# Altium footprint library JL_PCB.PCBLIB: 1129 footprints (part 12 of 72)
Each footprint in its own frame and in the unit in brackets; x right, y up, seen from the top. Pads: shape width x height; smd on the part's side, far side on the other; paste and mask are expansions set on the pad; w line width, h text height; cw(c..) or ccw(c..) is an arc to the next point about the centre after c.
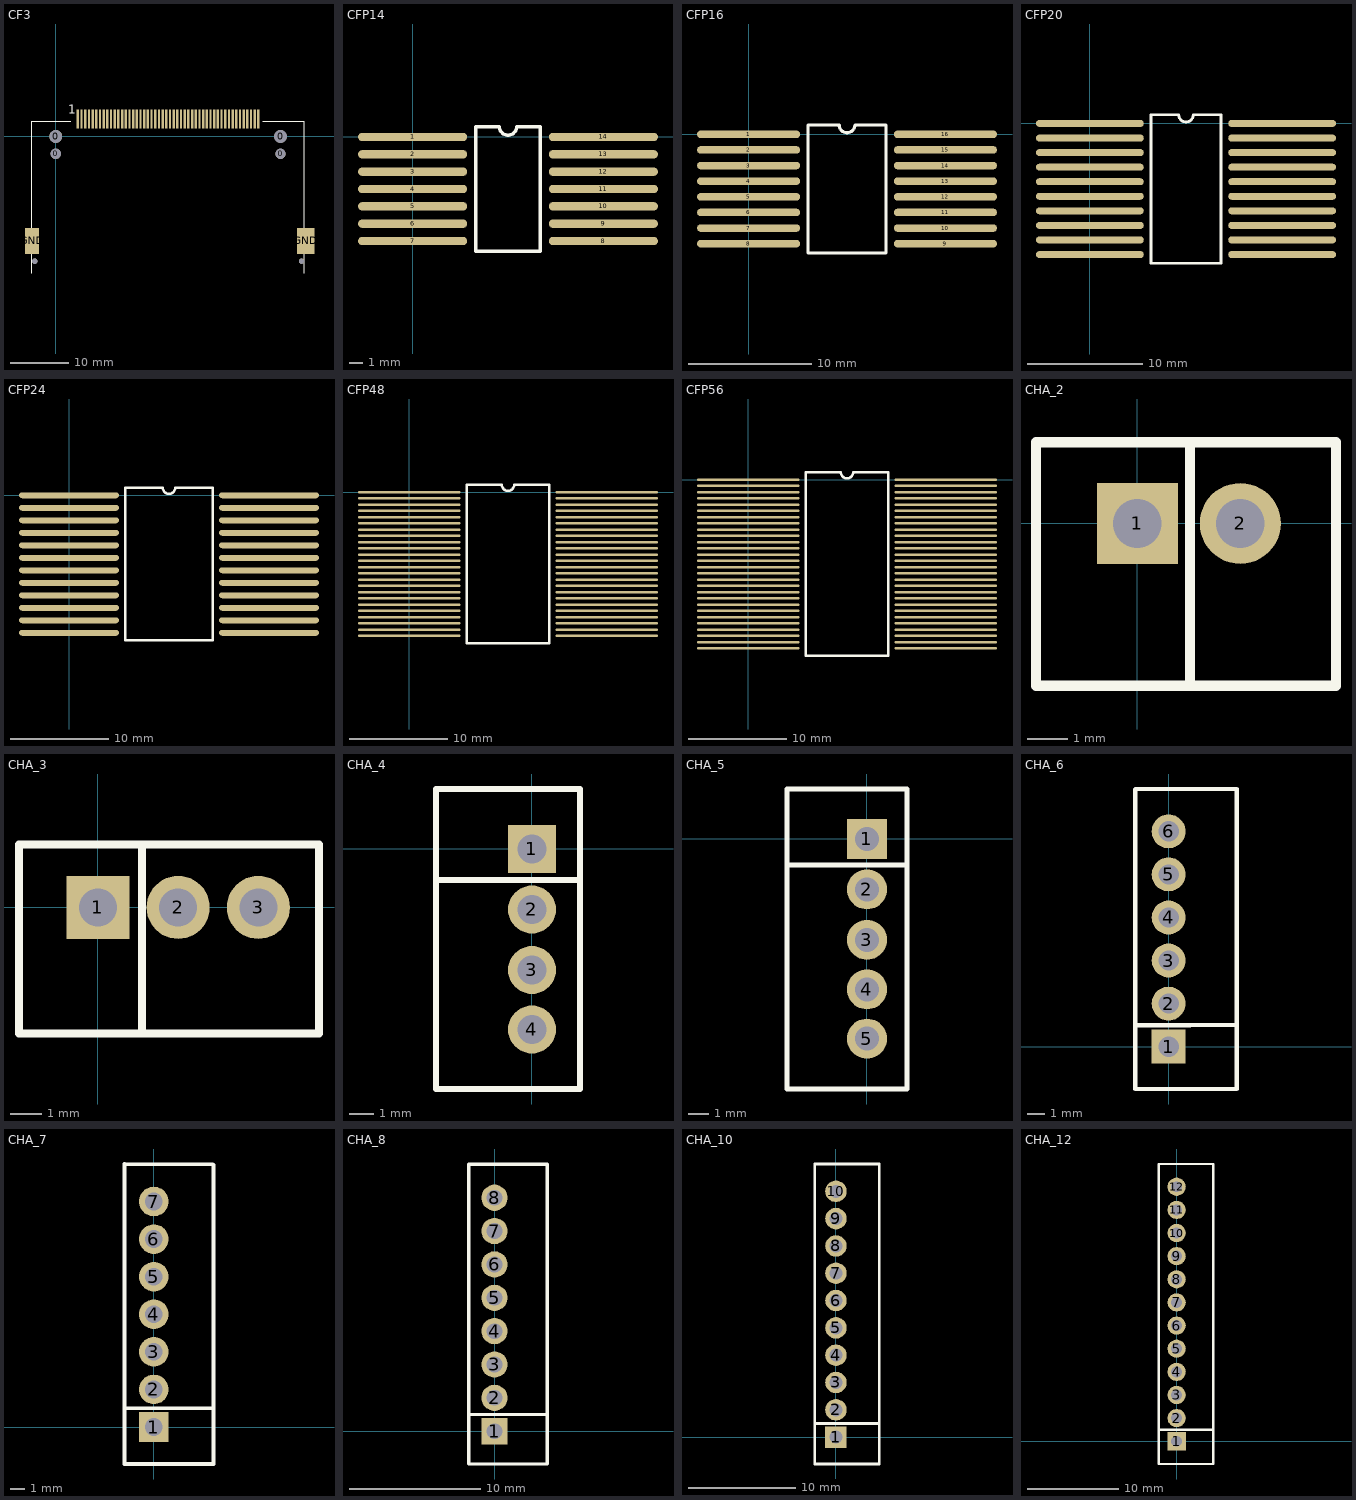
[diagram p11: the footprints below, top view; thin cyan lines are the x and y axes]

## CF3 [mm]
pads (58):
  round 0.9 hole 0.9 unplated: 0(-3.63,-21.5) 0(42.37,-21.5)
  round 1.75 hole 1.75 unplated: 0(0,-3) 0(38.735,-3)
  round 2.2 hole 2.2 unplated: 0(0,0) 0(38.735,0)
  rect 0.4x3.302 smd: 1(3.81,3.004) 2(5.08,3.004) 3(6.35,3.004) 4(7.62,3.004) 5(8.89,3.004) 6(10.16,3.004) 7(11.43,3.004) 8(12.7,3.004) 9(13.97,3.004) 10(15.24,3.004) 11(16.51,3.004) 12(17.78,3.004) 13(19.05,3.004) 14(20.32,3.004) 15(21.59,3.004) 16(22.86,3.004) 17(24.13,3.004) 18(25.4,3.004) 19(26.67,3.004) 20(27.94,3.004) 21(29.21,3.004) 22(30.48,3.004) 23(31.75,3.004) 24(33.02,3.004) 25(34.29,3.004) 26(4.445,3.004) 27(5.715,3.004) 28(6.985,3.004) 29(8.255,3.004) 30(9.525,3.004) 31(10.795,3.004) 32(12.065,3.004) 33(13.335,3.004) 34(14.605,3.004) 35(15.875,3.004) 36(17.145,3.004) 37(18.415,3.004) 38(19.685,3.004) 39(20.955,3.004) 40(22.225,3.004) 41(23.495,3.004) 42(24.765,3.004) 43(26.035,3.004) 44(27.305,3.004) 45(28.575,3.004) 46(29.845,3.004) 47(31.115,3.004) 48(32.385,3.004) 49(33.655,3.004) 50(34.925,3.004)
  rect 2.4x4.5 smd: GND(-4.09,-18)
  rect 3x4.5 smd: GND(43.12,-18)
TopOverlay:
  lines w0.152: -4.13,2.6 2.585,2.6 ; 35.66,2.6 42.87,2.6
  lines w0.2: -4.13,-23.6 -4.13,2.6 ; 42.87,-23.6 42.87,2.6
  text "1" at 2.11,3.95 h1.52

## CFP14 [mil]
pads (14):
  oval 315x24 smd: 1(0,0) 2(0,-50) 3(0,-100) 4(0,-150) 5(0,-200) 6(0,-250) 7(0,-300) 8(550,-300) 9(550,-250) 10(550,-200) 11(550,-150) 12(550,-100) 13(550,-50) 14(550,0)
TopOverlay:
  lines w10: 182,-330 182,30 250,30 ccw(c275,30) 300,30 368,30 368,-330 182,-330

## CFP16 [mil]
pads (16):
  oval 330x24 smd: 1(0,0) 2(0,-50) 3(0,-100) 4(0,-150) 5(0,-200) 6(0,-250) 7(0,-300) 8(0,-350) 9(630,-350) 10(630,-300) 11(630,-250) 12(630,-200) 13(630,-150) 14(630,-100) 15(630,-50) 16(630,0)
TopOverlay:
  lines w10: 190,-380 190,30 290,30 ccw(c315,30) 340,30 440,30 440,-380 190,-380

## CFP20 [mil]
pads (20):
  oval 370x24 smd: 1(0,0) 2(0,-50) 3(0,-100) 4(0,-150) 5(0,-200) 6(0,-250) 7(0,-300) 8(0,-350) 9(0,-400) 10(0,-450) 11(660,-450) 12(660,-400) 13(660,-350) 14(660,-300) 15(660,-250) 16(660,-200) 17(660,-150) 18(660,-100) 19(660,-50) 20(660,0)
TopOverlay:
  lines w10: 210,-480 210,30 305,30 ccw(c330,30) 355,30 450,30 450,-480 210,-480

## CFP24 [mil]
pads (24):
  oval 400x24 smd: 1(0,0) 2(0,-50) 3(0,-100) 4(0,-150) 5(0,-200) 6(0,-250) 7(0,-300) 8(0,-350) 9(0,-400) 10(0,-450) 11(0,-500) 12(0,-550) 13(800,-550) 14(800,-500) 15(800,-450) 16(800,-400) 17(800,-350) 18(800,-300) 19(800,-250) 20(800,-200) 21(800,-150) 22(800,-100) 23(800,-50) 24(800,0)
TopOverlay:
  lines w10: 225,-580 225,30 375,30 ccw(c400,30) 425,30 575,30 575,-580 225,-580

## CFP48 [mil]
pads (48):
  oval 410x10 smd: 1(0,0) 2(0,-25) 3(0,-50) 4(0,-75) 5(0,-100) 6(0,-125) 7(0,-150) 8(0,-175) 9(0,-200) 10(0,-225) 11(0,-250) 12(0,-275) 13(0,-300) 14(0,-325) 15(0,-350) 16(0,-375) 17(0,-400) 18(0,-425) 19(0,-450) 20(0,-475) 21(0,-500) 22(0,-525) 23(0,-550) 24(0,-575) 25(790,-575) 26(790,-550) 27(790,-525) 28(790,-500) 29(790,-475) 30(790,-450) 31(790,-425) 32(790,-400) 33(790,-375) 34(790,-350) 35(790,-325) 36(790,-300) 37(790,-275) 38(790,-250) 39(790,-225) 40(790,-200) 41(790,-175) 42(790,-150) 43(790,-125) 44(790,-100) 45(790,-75) 46(790,-50) 47(790,-25) 48(790,0)
TopOverlay:
  lines w10: 230,-605 230,30 370,30 ccw(c395,30) 420,30 560,30 560,-605 230,-605

## CFP56 [mil]
pads (56):
  oval 410x10 smd: 1(0,0) 2(0,-25) 3(0,-50) 4(0,-75) 5(0,-100) 6(0,-125) 7(0,-150) 8(0,-175) 9(0,-200) 10(0,-225) 11(0,-250) 12(0,-275) 13(0,-300) 14(0,-325) 15(0,-350) 16(0,-375) 17(0,-400) 18(0,-425) 19(0,-450) 20(0,-475) 21(0,-500) 22(0,-525) 23(0,-550) 24(0,-575) 25(0,-600) 26(0,-625) 27(0,-650) 28(0,-675) 29(790,-675) 30(790,-650) 31(790,-625) 32(790,-600) 33(790,-575) 34(790,-550) 35(790,-525) 36(790,-500) 37(790,-475) 38(790,-450) 39(790,-425) 40(790,-400) 41(790,-375) 42(790,-350) 43(790,-325) 44(790,-300) 45(790,-275) 46(790,-250) 47(790,-225) 48(790,-200) 49(790,-175) 50(790,-150) 51(790,-125) 52(790,-100) 53(790,-75) 54(790,-50) 55(790,-25) 56(790,0)
TopOverlay:
  lines w10: 230,-705 560,-705 560,30 420,30 cw(c395,30) 370,30 230,30 230,-705

## CHA_2 [mm]
pads (2):
  rect 2x2 hole 1.2: 1(0,0)
  round 2 hole 1.2: 2(2.54,0)
TopOverlay:
  lines w0.254: -0.5,2 -2.5,2 ; 1.3,-4 1.3,2 ; -2.5,2 4.5,2 4.9,2 4.9,-4 4.5,-4 -2.5,-4 -2.5,2

## CHA_3 [mm]
pads (3):
  rect 2x2 hole 1.2: 1(0,0)
  round 2 hole 1.2: 2(2.54,0) 3(5.08,0)
TopOverlay:
  lines w0.254: -0.5,2 -2.5,2 ; 1.4,-4 1.4,2 ; -2.5,2 0,2 7,2 7,-4 -2.5,-4 -2.5,2

## CHA_4 [mm]
pads (4):
  rect 2x2 hole 1.2: 1(0,0)
  round 2 hole 1.2: 2(0,-2.52) 3(0,-5.04) 4(0,-7.52)
TopOverlay:
  lines w0.254: -4,-1.3 2,-1.3 ; 2,0 2,2.5 ; 2,0 2,2.5 ; 2,0 2,2.5 ; 2,0 2,2.5 ; 2,2.5 -4,2.5 -4,-10 2,-10 2,-8 2,2.5

## CHA_5 [mm]
pads (5):
  rect 2x2 hole 1.2: 1(0,0)
  round 2 hole 1.2: 2(0,-2.52) 3(0,-5.04) 4(0,-7.52) 5(0,-9.98)
TopOverlay:
  lines w0.254: -4,-1.3 2,-1.3 ; 2,0 2,2.5 ; 2,0 2,2.5 ; 2,0 2,2.5 ; 2,0 2,2.5 ; 2,2.5 -4,2.5 -4,-10 -4,-12.5 0,-12.5 2,-12.5 2,-10 2,-8 2,2.5

## CHA_6 [mm]
pads (6):
  rect 2x2 hole 1.2: 1(0,0)
  round 2 hole 1.2: 2(0,2.54) 3(0,5.08) 4(0,7.62) 5(0,10.16) 6(0,12.7)
TopOverlay:
  lines w0.254: -1.975,1.275 -1.97,1.27 -1.27,1.27 1.27,1.27 ; 1.275,1.275 4.025,1.275 ; 4.025,15.2 1.265,15.2 -1.275,15.2 -1.95,15.2 -1.975,15.175 -1.975,13.9 -1.975,-2.5 4.025,-2.5 4.025,13.9 4.025,15.2 ; 4.025,15.2 4.025,15.2

## CHA_7 [mm]
pads (7):
  rect 2x2 hole 1.2: 1(0,0)
  round 2 hole 1.2: 2(0,2.54) 3(0,5.08) 4(0,7.62) 5(0,10.16) 6(0,12.7) 7(0,15.24)
TopOverlay:
  lines w0.254: -1.975,1.275 -1.97,1.27 -1.27,1.27 1.27,1.27 ; 1.275,1.275 4.025,1.275 ; 3.975,17.75 4.025,17.7 4.025,15.2 4.025,13.9 4.025,-2.5 -1.975,-2.5 -1.975,13.9 -1.975,15.175 -1.975,17.775 -1.95,17.75 -1.325,17.75 1.215,17.75 3.975,17.75 ; 3.975,17.75 3.975,17.75

## CHA_8 [mm]
pads (8):
  rect 2x2 hole 1.2: 1(0,0)
  round 2 hole 1.2: 2(0,2.54) 3(0,5.08) 4(0,7.62) 5(0,10.16) 6(0,12.7) 7(0,15.24) 8(0,17.78)
TopOverlay:
  lines w0.254: -1.975,1.275 -1.97,1.27 -1.27,1.27 1.27,1.27 ; -1.975,20.35 -1.945,20.32 ; 1.275,1.275 4.025,1.275 ; 4.025,20.29 4.025,15.2 ; 4.025,20.35 3.995,20.32 2.54,20.32 0,20.32 -1.945,20.32 ; -1.945,20.32 -1.975,20.29 -1.975,15.175 -1.975,13.9 -1.975,-2.5 4.025,-2.5 4.025,13.9 4.025,15.2 ; 4.025,15.2 4.025,15.2

## CHA_10 [mm]
pads (10):
  rect 2x2 hole 1.2: 1(0,0)
  round 2 hole 1.2: 2(0,2.54) 3(0,5.08) 4(0,7.62) 5(0,10.16) 6(0,12.7) 7(0,15.24) 8(0,17.78) 9(0,20.32) 10(0,22.86)
TopOverlay:
  lines w0.254: -1.975,1.275 -1.97,1.27 -1.27,1.27 1.27,1.27 ; 1.275,1.275 4.025,1.275 ; -1.975,25.4 0,25.4 4.025,25.4 ; -1.975,25.4 -1.975,15.175 -1.975,13.9 -1.975,-2.5 4.025,-2.5 4.025,13.9 4.025,15.2 ; -1.975,25.4 -1.975,25.4 ; 4.025,15.2 4.025,15.2 ; 4.025,15.2 4.025,25.4 ; 4.025,25.4 4.025,25.4 ; 4.025,25.4 4.025,25.4

## CHA_12 [mm]
pads (12):
  rect 2x2 hole 1.2: 1(0,0)
  round 2 hole 1.2: 2(0,2.54) 3(0,5.08) 4(0,7.62) 5(0,10.16) 6(0,12.7) 7(0,15.24) 8(0,17.78) 9(0,20.32) 10(0,22.86) 11(0,25.4) 12(0,27.94)
TopOverlay:
  lines w0.254: -1.975,1.275 -1.97,1.27 -1.27,1.27 1.27,1.27 ; -1.975,29.14 -1.975,30.415 ; 1.275,1.275 4.025,1.275 ; 4.025,12.74 4.025,29.14 4.025,30.44 ; -1.975,30.415 -1.975,15.175 -1.975,13.9 -1.975,-2.5 4.025,-2.5 4.025,13.9 4.025,15.2 ; -1.975,30.415 -1.95,30.44 -1.275,30.44 1.265,30.44 4.025,30.44 ; 4.025,15.2 4.025,15.2 ; 4.025,30.44 4.025,30.44